# Altium footprint library FootprintSMD.PcbLib: 140 footprints (part 9 of 9)
Each footprint in its own frame and in the unit in brackets; x right, y up, seen from the top. Pads: shape width x height; smd on the part's side, far side on the other; paste and mask are expansions set on the pad; w line width, h text height; cw(c..) or ccw(c..) is an arc to the next point about the centre after c.
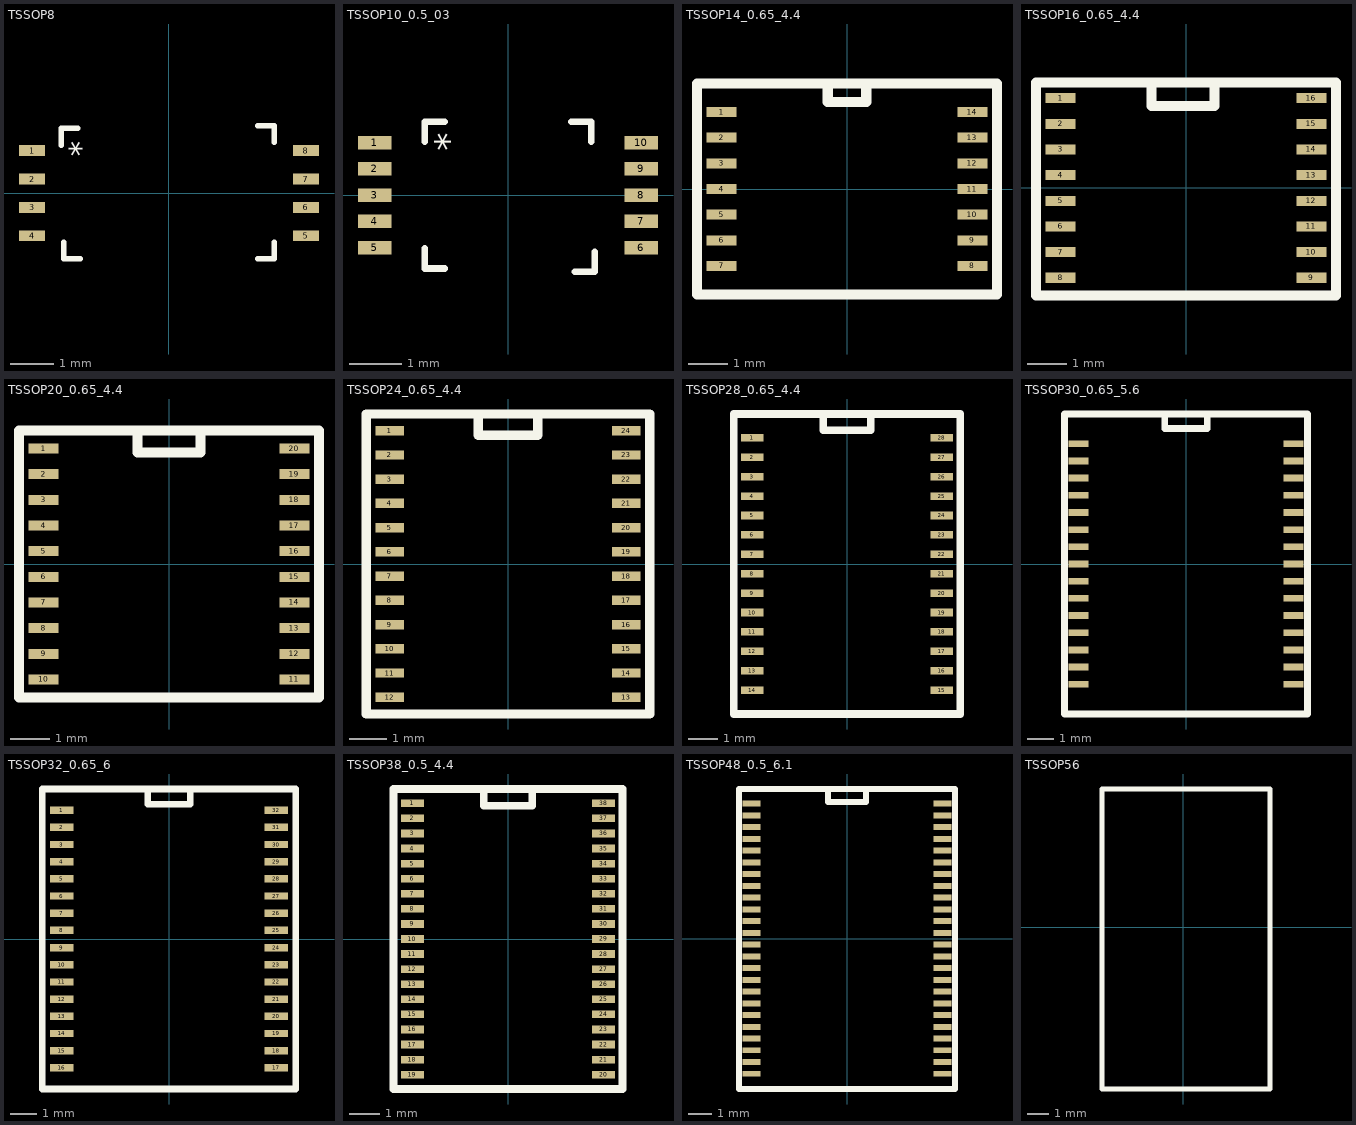
[diagram p8: the footprints below, top view; thin cyan lines are the x and y axes]

## TSSOP8 [mm]
pads (8):
  rect 0.6x0.25 smd: 1(-3.137,0.975) 2(-3.137,0.325) 3(-3.137,-0.325) 4(-3.137,-0.975) 5(3.138,-0.975) 6(3.138,-0.325) 7(3.138,0.325) 8(3.138,0.975)
Top Overlay:
  lines w0.127: -2.473,1.103 -2.473,1.484 -2.092,1.484 ; -2.41,-1.12 -2.41,-1.501 -2.029,-1.501 ; 2.035,-1.501 2.416,-1.501 2.416,-1.12 ; 2.035,1.547 2.416,1.547 2.416,1.166
  text "*" at -1.778,1.185 h0.51
3D body "User Library-TSSOP-8 3_1x4_4.STEP": height 1.1, standoff 0, extent -3.188,-1.55 3.212,1.55

## TSSOP10_0.5_03 [mil]
pads (10):
  rect 25x10 smd: 1(-100,39.37) 2(-100,19.69) 3(-100,0) 4(-100,-19.68) 5(-100,-39.37) 6(100,-39.37) 7(100,-19.68) 8(100,0) 9(100,19.69) 10(100,39.37)
Top Overlay:
  lines w5: -62.5,-40 -62.5,-55 -47.5,-55 ; -62.5,40 -62.5,55 -47.5,55 ; 47.5,55 62.5,55 62.5,40 ; 50,-57.5 65,-57.5 65,-42.5
  text "*" at -35,46.66 h20
3D body "User Library-TSSOP-10.STEP": height 43.31, standoff 0, extent -98.43,-59.06 98.42,59.05

## TSSOP14_0.65_4.4 [mil]
pads (14):
  rect 30x10 smd: 1(-125,76.77) 2(-125,51.18) 3(-125,25.59) 4(-125,0) 5(-125,-25.59) 6(-125,-51.18) 7(-125,-76.77) 8(125,-76.77) 9(125,-51.18) 10(125,-25.59) 11(125,0) 12(125,25.59) 13(125,51.18) 14(125,76.77)
Top Overlay:
  lines w10: -19.19,104.33 -19.19,86.61 19.19,86.61 19.19,104.33 ; -149.61,-105.31 149.61,-105.31 149.61,105.31 -149.61,105.31 -149.61,-105.31
3D body "User Library-TSSOP-14 5_1x4_4.STEP": height 42.52, standoff -0.79, extent -125.98,-100.4 125.98,100.39

## TSSOP16_0.65_4.4 [mil]
pads (16):
  rect 30x10 smd: 1(-125,89.57) 2(-125,63.98) 3(-125,38.39) 4(-125,12.8) 5(-125,-12.8) 6(-125,-38.39) 7(-125,-63.98) 8(-125,-89.57) 9(125,-89.57) 10(125,-63.98) 11(125,-38.39) 12(125,-12.8) 13(125,12.8) 14(125,38.39) 15(125,63.98) 16(125,89.57)
Top Overlay:
  lines w10: -34.45,102.95 -34.45,81.69 28.54,81.69 28.54,103.95 ; -149.61,-107.05 -149.61,104.95 149.61,104.95 149.61,-107.05 -149.61,-107.05
3D body "User Library-TSSOP-16 5_1x4_4.STEP": height 43.31, standoff 0, extent -125.98,-100.4 125.98,100.39

## TSSOP20_0.65_4.4 [mil]
pads (20):
  rect 30x10 smd: 1(-125,115.16) 2(-125,89.57) 3(-125,63.98) 4(-125,38.39) 5(-125,12.8) 6(-125,-12.8) 7(-125,-38.39) 8(-125,-63.98) 9(-125,-89.57) 10(-125,-115.16) 11(125,-115.16) 12(125,-89.57) 13(125,-63.98) 14(125,-38.39) 15(125,-12.8) 16(125,12.8) 17(125,38.39) 18(125,63.98) 19(125,89.57) 20(125,115.16)
Top Overlay:
  lines w10: -31.5,132.48 -31.5,111.22 31.5,111.22 31.5,131.89 ; -149.61,-133 149.61,-133 149.61,133 -149.61,133 -149.61,-133
3D body "User Library-TSSOP20-1.STEP": height 43, standoff 0, extent -123.62,-127.95 123.62,127.96

## TSSOP24_0.65_4.4 [mil]
pads (24):
  rect 30x10 smd: 1(-125,140.75) 2(-125,115.16) 3(-125,89.57) 4(-125,63.98) 5(-125,38.39) 6(-125,12.8) 7(-125,-12.8) 8(-125,-38.39) 9(-125,-63.98) 10(-125,-89.57) 11(-125,-115.16) 12(-125,-140.75) 13(125,-140.75) 14(125,-115.16) 15(125,-89.57) 16(125,-63.98) 17(125,-38.39) 18(125,-12.8) 19(125,12.8) 20(125,38.39) 21(125,63.98) 22(125,89.57) 23(125,115.16) 24(125,140.75)
Top Overlay:
  lines w10: -31.5,157.09 -31.5,135.83 31.5,135.83 31.5,156.5 ; -149.61,-158.46 -149.61,158.46 149.61,158.46 149.61,-158.46 -149.61,-158.46
3D body "User Library-TSSOP-24.STEP": height 47.24, standoff 0, extent -125.98,-153.54 125.99,153.54

## TSSOP28_0.65_4.4 [mil]
pads (28):
  rect 30x10 smd: 1(-125,166.34) 2(-125,140.75) 3(-125,115.16) 4(-125,89.57) 5(-125,63.98) 6(-125,38.39) 7(-125,12.8) 8(-125,-12.8) 9(-125,-38.39) 10(-125,-63.98) 11(-125,-89.57) 12(-125,-115.16) 13(-125,-140.75) 14(-125,-166.34) 15(125,-166.34) 16(125,-140.75) 17(125,-115.16) 18(125,-89.57) 19(125,-63.98) 20(125,-38.39) 21(125,-12.8) 22(125,12.8) 23(125,38.39) 24(125,63.98) 25(125,89.57) 26(125,115.16) 27(125,140.75) 28(125,166.34)
Top Overlay:
  lines w10: -31.5,197.44 -31.5,176.18 31.5,176.18 31.5,196.85 ; -149.61,-197.83 149.61,-197.83 149.61,197.83 -149.61,197.83 -149.61,-197.83
3D body "User Library-TSSOP-28 9_8x4_4.STEP": height 43.31, standoff 0, extent -125,-192.91 126.97,192.91

## TSSOP30_0.65_5.6 [mil]
pads (30):
  rect 30x10 smd: 1(-160,179.13) 2(-160,153.54) 3(-160,127.95) 4(-160,102.36) 5(-160,76.77) 6(-160,51.18) 7(-160,25.59) 8(-160,0) 9(-160,-25.59) 10(-160,-51.18) 11(-160,-76.77) 12(-160,-102.36) 13(-160,-127.95) 14(-160,-153.54) 15(-160,-179.13) 16(160,-179.13) 17(160,-153.54) 18(160,-127.95) 19(160,-102.36) 20(160,-76.77) 21(160,-51.18) 22(160,-25.59) 23(160,0) 24(160,25.59) 25(160,51.18) 26(160,76.77) 27(160,102.36) 28(160,127.95) 29(160,153.54) 30(160,179.13)
Top Overlay:
  lines w10: -31.5,223.03 -31.5,201.77 31.5,201.77 31.5,222.44 ; -181.1,-223.43 181.1,-223.43 181.1,223.43 -181.1,223.43 -181.1,-223.43
3D body "User Library-TSSOP-30 11_1x6_2.STEP": height 43.31, standoff 0, extent -159.46,-218.51 159.44,218.49

## TSSOP32_0.65_6 [mil]
pads (32):
  rect 35x11 smd: 1(-160,191.93) 2(-160,166.34) 3(-160,140.75) 4(-160,115.16) 5(-160,89.57) 6(-160,63.98) 7(-160,38.39) 8(-160,12.8) 9(-160,-12.8) 10(-160,-38.39) 11(-160,-63.98) 12(-160,-89.57) 13(-160,-115.16) 14(-160,-140.75) 15(-160,-166.34) 16(-160,-191.93) 17(160,-191.93) 18(160,-166.34) 19(160,-140.75) 20(160,-115.16) 21(160,-89.57) 22(160,-63.98) 23(160,-38.39) 24(160,-12.8) 25(160,12.8) 26(160,38.39) 27(160,63.98) 28(160,89.57) 29(160,115.16) 30(160,140.75) 31(160,166.34) 32(160,191.93)
Top Overlay:
  lines w10: -31.5,222.05 -31.5,200.79 31.5,200.79 31.5,221.46 ; -188.98,-223.43 -188.98,223.43 188.98,223.43 188.98,-223.43 -188.98,-223.43
3D body "User Library-TSSOP-32 11_1x6_2.STEP": height 42.52, standoff -0.79, extent -159.45,-218.5 159.45,218.5

## TSSOP38_0.5_4.4 [mil]
pads (38):
  rect 30x10 smd: 1(-125,177.17) 2(-125,157.48) 3(-125,137.8) 4(-125,118.11) 5(-125,98.43) 6(-125,78.74) 7(-125,59.06) 8(-125,39.37) 9(-125,19.68) 10(-125,0) 11(-125,-19.69) 12(-125,-39.37) 13(-125,-59.06) 14(-125,-78.74) 15(-125,-98.43) 16(-125,-118.11) 17(-125,-137.8) 18(-125,-157.48) 19(-125,-177.17) 20(125,-177.17) 21(125,-157.48) 22(125,-137.8) 23(125,-118.11) 24(125,-98.43) 25(125,-78.74) 26(125,-59.06) 27(125,-39.37) 28(125,-19.68) 29(125,0) 30(125,19.69) 31(125,39.37) 32(125,59.06) 33(125,78.74) 34(125,98.43) 35(125,118.11) 36(125,137.8) 37(125,157.48) 38(125,177.17)
Top Overlay:
  lines w10: -31.5,195.47 -31.5,174.21 31.5,174.21 31.5,194.88 ; -149.61,-195.87 149.61,-195.87 149.61,195.87 -149.61,195.87 -149.61,-195.87
3D body "User Library-TSSOP-38-1.STEP": height 47.24, standoff 0, extent -125.98,-190.94 125.99,190.94

## TSSOP48_0.5_6.1 [mil]
pads (48):
  rect 30x10 smd: 1(-160,226.38) 2(-160,206.69) 3(-160,187.01) 4(-160,167.32) 5(-160,147.64) 6(-160,127.95) 7(-160,108.27) 8(-160,88.58) 9(-160,68.9) 10(-160,49.21) 11(-160,29.53) 12(-160,9.84) 13(-160,-9.84) 14(-160,-29.53) 15(-160,-49.21) 16(-160,-68.9) 17(-160,-88.58) 18(-160,-108.27) 19(-160,-127.95) 20(-160,-147.64) 21(-160,-167.32) 22(-160,-187.01) 23(-160,-206.69) 24(-160,-226.38) 25(160,-226.38) 26(160,-206.69) 27(160,-187.01) 28(160,-167.32) 29(160,-147.64) 30(160,-127.95) 31(160,-108.27) 32(160,-88.58) 33(160,-68.9) 34(160,-49.21) 35(160,-29.53) 36(160,-9.84) 37(160,9.84) 38(160,29.53) 39(160,49.21) 40(160,68.9) 41(160,88.58) 42(160,108.27) 43(160,127.95) 44(160,147.64) 45(160,167.32) 46(160,187.01) 47(160,206.69) 48(160,226.38)
Top Overlay:
  lines w10: -31.5,250.59 -31.5,229.33 31.5,229.33 31.5,250 ; -181.1,-251.97 181.1,-251.97 181.1,250.98 -181.1,250.98 -181.1,-251.97
3D body "User Library-TSSOP-48W.STEP": height 47.24, standoff 0, extent -159.44,-246.07 159.46,246.06

## TSSOP56 [mil]
Top Overlay:
  lines w10: -150.59,-299.21 -150.59,255.91 160.44,255.91 160.44,-299.21 -150.59,-299.21
3D body "User Library-TSSOP-56 14_1x6_2.STEP": height 19.68, standoff -23.62, extent -150.59,-299.21 160.44,255.91